# Altium schematic symbol library LTSpiceLibrary.SchLib: 776 symbols (part 3 of 3) (continued)
## LTC6419
designator X?  value LTC6419  InstName: X?
Prefix: X; Value2: LTC6409; Description: Dual 10GHz GBW, 1.1nV/ Hz� Differential Amplifier/ADC Driver; SpiceModel: LTC6.lib
pins: 1 OUT-, 2 IN+, 3 SHDN, 4 V+, 5 VOCM, 6 IN-, 7 OUT+, 8 V-

## LTC6560
designator X?  value LTC6560  InstName: X?
Prefix: X; Description: Single Channel Transimpedance Amplifier with Output Multiplexing; Value2: LTC6560; SpiceModel: LTC3.lib
pins: 1 Vcco, 2 In, 3 Vref, 4 Vcci, 5 O_Mux, 6 OutTerm, 7 Out, 8 Gnd

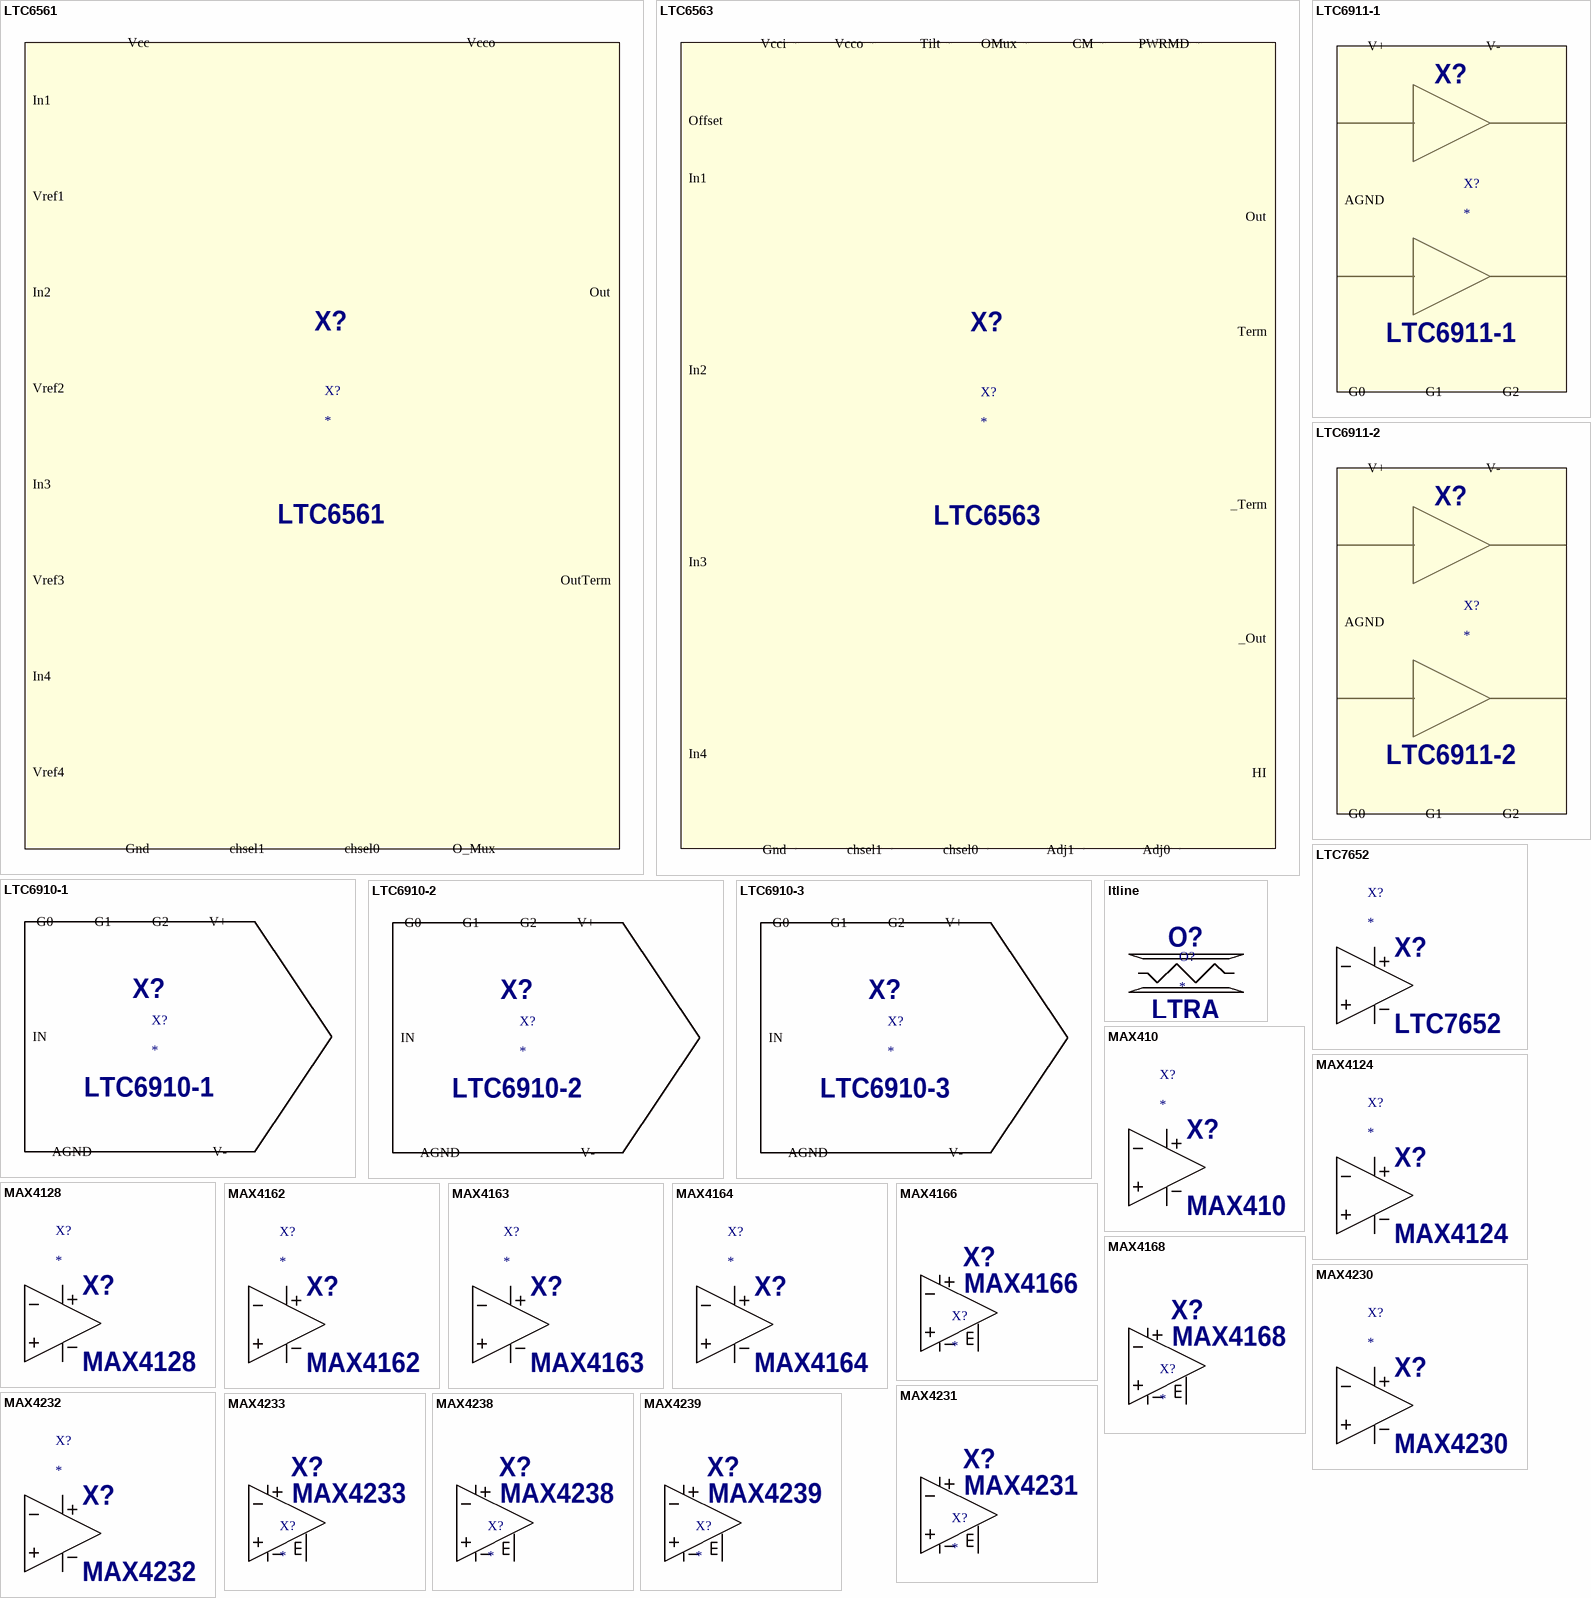
[diagram p24: symbols LTC6561 to MAX4239]

## LTC6561
designator X?  value LTC6561  InstName: X?
Prefix: X; Description: Four-Channel Multiplexed Transimpedance Amplifier with Output Multiplexing; Value2: LTC6561; SpiceModel: LTC7.lib
pins: 1 Vcco, 2 chsel0, 3 Vcc, 4 Vref1, 5 Vref2, 6 Vref3, 7 Vref4, 8 Gnd, 9 In1, 10 In2, 11 In3, 12 In4, 13 O_Mux, 14 chsel1, 15 Out, 16 OutTerm

## LTC6563
designator X?  value LTC6563  InstName: X?
Prefix: X; Description: Four-Channel Multiplexed Transimpedance Amplifier with Output Multiplexing; Value2: LTC6563; SpiceModel: LTC6563.lib
pins: 1 Vcco, 2 Gnd, 3 Vcci, 4 In1, 5 In2, 6 In3, 7 In4, 8 Offset, 9 chsel1, 10 chsel0, 11 Adj1, 12 Adj0, 13 OMux, 14 Tilt, 15 CM, 16 PWRMD, 17 HI, 18 Out, 19 _Out, 20 Term, 21 _Term

## LTC6910-1
designator X?  value LTC6910-1  InstName: X?
Prefix: X; Description: Digitally Controlled Programmable Gain Amplifiers in SOT-23; SpiceModel: LTC1.LIB; Value2: LTC6910-1
pins: 1 OUT, 2 AGND, 3 IN, 4 V-, 5 G0, 6 G1, 7 G2, 8 V+

## LTC6910-2
designator X?  value LTC6910-2  InstName: X?
Prefix: X; Description: Digitally Controlled Programmable Gain Amplifiers in SOT-23; SpiceModel: LTC1.LIB; Value2: LTC6910-2
pins: 1 OUT, 2 AGND, 3 IN, 4 V-, 5 G0, 6 G1, 7 G2, 8 V+

## LTC6910-3
designator X?  value LTC6910-3  InstName: X?
Prefix: X; Description: Digitally Controlled Programmable Gain Amplifiers in SOT-23; SpiceModel: LTC1.LIB; Value2: LTC6910-3
pins: 1 OUT, 2 AGND, 3 IN, 4 V-, 5 G0, 6 G1, 7 G2, 8 V+

## LTC6911-1
designator X?  value LTC6911-1  InstName: X?
Prefix: X; Description: Dual Matched Amplifiers with Digitally Programmable Gain in MSOP; SpiceModel: LTC1.LIB; Value2: LTC6911-1
pins: 1 INA, 2 AGND, 3 INB, 4 G0, 5 G1, 6 G2, 7 V+, 8 OUTB, 9 V-, 10 OUTA

## LTC6911-2
designator X?  value LTC6911-2  InstName: X?
Prefix: X; Description: Dual Matched Amplifiers with Digitally Programmable Gain in MSOP; SpiceModel: LTC1.LIB; Value2: LTC6911-2
pins: 1 INA, 2 AGND, 3 INB, 4 G0, 5 G1, 6 G2, 7 V+, 8 OUTB, 9 V-, 10 OUTA

## LTC7652
designator X?  value LTC7652  InstName: X?
Prefix: X; Value2: LTC1052; Description: Chopper-Stabilized Operational Amplifier; SpiceModel: LTC.lib
pins: 1 In+, 2 In-, 3 V+, 4 V-, 5 OUT

## ltline
designator O?  value LTRA  InstName: O?
Prefix: O; Description: Lossy Transmission Line.  Note: You must supply the .model for this device
pins: 1 I1, 2 R1, 3 I2, 4 R2

## MAX410
designator X?  value MAX410  InstName: X?
Prefix: X; Description: Single/Dual/Quad, 28MHz, Low-Noise, Low-Voltage, Precision Op Amps; SpiceModel: MAX410.lib; Value2: MAX410
pins: 1 In+, 2 In-, 3 V+, 4 V-, 5 OUT

## MAX4124
designator X?  value MAX4124  InstName: X?
Prefix: X; Description: Single/Dual/Quad, Wide-Bandwidth, Low-Power, Single-Supply Rail-to-Rail I/O Op Amps; SpiceModel: MAX4124.lib; Value2: MAX4124
pins: 1 In+, 2 In-, 3 V+, 4 V-, 5 OUT

## MAX4128
designator X?  value MAX4128  InstName: X?
Prefix: X; Description: Single/Dual/Quad, Wide-Bandwidth, Low-Power, Single-Supply Rail-to-Rail I/O Op Amps; SpiceModel: MAX4128.lib; Value2: MAX4128
pins: 1 In+, 2 In-, 3 V+, 4 V-, 5 OUT

## MAX4162
designator X?  value MAX4162  InstName: X?
Prefix: X; Description: UCSP, Micropower, Single-Supply, 10V, Rail-to-Rail I/O Op Amps; SpiceModel: MAX4162.lib; Value2: MAX4162
pins: 1 In+, 2 In-, 3 V+, 4 V-, 5 OUT

## MAX4163
designator X?  value MAX4163  InstName: X?
Prefix: X; Description: UCSP, Micropower, Single-Supply, 10V, Rail-to-Rail I/O Op Amps; SpiceModel: MAX4163.lib; Value2: MAX4163
pins: 1 In+, 2 In-, 3 V+, 4 V-, 5 OUT

## MAX4164
designator X?  value MAX4164  InstName: X?
Prefix: X; Description: UCSP, Micropower, Single-Supply, 10V, Rail-to-Rail I/O Op Amps; SpiceModel: MAX4164.lib; Value2: MAX4164
pins: 1 In+, 2 In-, 3 V+, 4 V-, 5 OUT

## MAX4166
designator X?  value MAX4166  InstName: X?
Prefix: X; Description: High-Output-Drive, Precision, Low-Power, Single-Supply, Rail-to-Rail I/O Op Amps with Shutdown; SpiceModel: MAX4166.lib; Value2: MAX4166
pins: 1 In+, 2 In-, 3 V+, 4 V-, 5 OUT, 6 SHDN

## MAX4168
designator X?  value MAX4168  InstName: X?
Prefix: X; Description: High-Output-Drive, Precision, Low-Power, Single-Supply, Rail-to-Rail I/O Op Amps with Shutdown; SpiceModel: MAX4168.lib; Value2: MAX4168
pins: 1 In+, 2 In-, 3 V+, 4 V-, 5 OUT, 6 SHDN

## MAX4230
designator X?  value MAX4230  InstName: X?
Prefix: X; Description: High-Output-Drive, 10MHz, 10V/us, Rail-to-Rail I/O Op Amps with Shutdown in SC70; SpiceModel: MAX4230.lib; Value2: MAX4230
pins: 1 In+, 2 In-, 3 V+, 4 V-, 5 OUT

## MAX4231
designator X?  value MAX4231  InstName: X?
Prefix: X; Description: High-Output-Drive, 10MHz, 10V/us, Rail-to-Rail I/O Op Amps with Shutdown in SC70; SpiceModel: MAX4231.lib; Value2: MAX4231
pins: 1 In+, 2 In-, 3 V+, 4 V-, 5 OUT, 6 SHDN

## MAX4232
designator X?  value MAX4232  InstName: X?
Prefix: X; Description: High-Output-Drive, 10MHz, 10V/us, Rail-to-Rail I/O Op Amps with Shutdown in SC70; SpiceModel: MAX4232.lib; Value2: MAX4232
pins: 1 In+, 2 In-, 3 V+, 4 V-, 5 OUT

## MAX4233
designator X?  value MAX4233  InstName: X?
Prefix: X; Description: High-Output-Drive, 10MHz, 10V/us, Rail-to-Rail I/O Op Amps with Shutdown in SC70; SpiceModel: MAX4233.lib; Value2: MAX4233
pins: 1 In+, 2 In-, 3 V+, 4 V-, 5 OUT, 6 SHDN

## MAX4238
designator X?  value MAX4238  InstName: X?
Prefix: X; Description: Ultra-Low Offset/Drift, Low-Noise, Precision SOT23 Amplifiers; SpiceModel: MAX4238.lib; Value2: MAX4238
pins: 1 In+, 2 In-, 3 V+, 4 V-, 5 OUT, 6 SHDN

## MAX4239
designator X?  value MAX4239  InstName: X?
Prefix: X; Description: Ultra-Low Offset/Drift, Low-Noise, Precision SOT23 Amplifiers; SpiceModel: MAX4239.lib; Value2: MAX4239
pins: 1 In+, 2 In-, 3 V+, 4 V-, 5 OUT, 6 SHDN

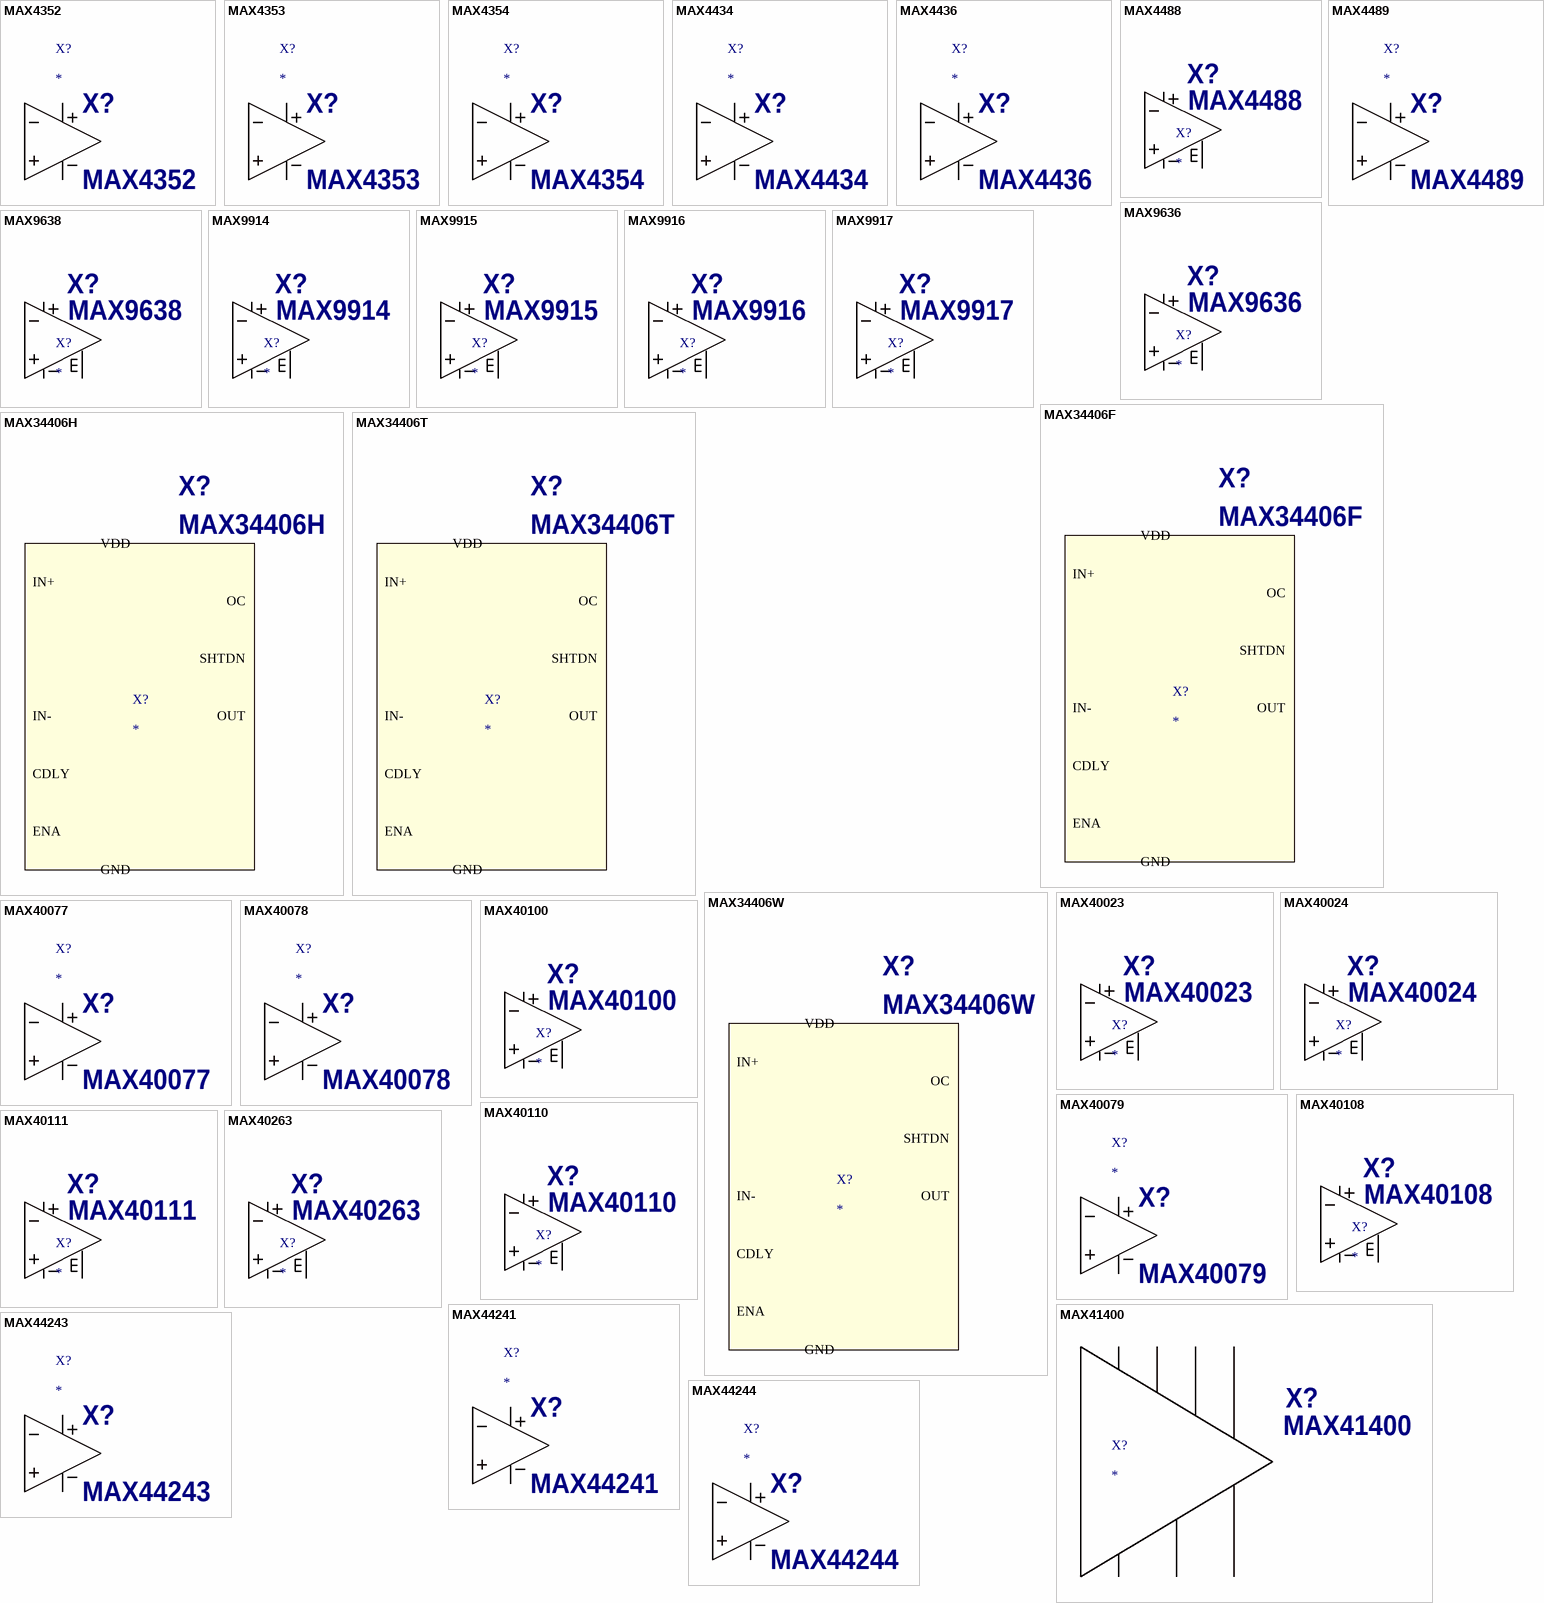
[diagram p25: symbols MAX4352 to MAX44244]

## MAX4352
designator X?  value MAX4352  InstName: X?
Prefix: X; Description: Low-Cost, +3V/+5V, 620uA, 200MHz, Single-Supply Op Amps with Rail-to-Rail Outputs; SpiceModel: MAX4352.lib; Value2: MAX4352
pins: 1 In+, 2 In-, 3 V+, 4 V-, 5 OUT

## MAX4353
designator X?  value MAX4353  InstName: X?
Prefix: X; Description: Low-Cost, +3V/+5V, 620uA, 200MHz, Single-Supply Op Amps with Rail-to-Rail Outputs; SpiceModel: MAX4353.lib; Value2: MAX4353
pins: 1 In+, 2 In-, 3 V+, 4 V-, 5 OUT

## MAX4354
designator X?  value MAX4354  InstName: X?
Prefix: X; Description: Low-Cost, +3V/+5V, 620uA, 200MHz, Single-Supply Op Amps with Rail-to-Rail Outputs; SpiceModel: MAX4354.lib; Value2: MAX4354
pins: 1 In+, 2 In-, 3 V+, 4 V-, 5 OUT

## MAX4434
designator X?  value MAX4434  InstName: X?
Prefix: X; Description: Single-Supply, 150MHz, 16-Bit Accurate, Ultra-Low Distortion Op Amps; SpiceModel: MAX4434.lib; Value2: MAX4434
pins: 1 In+, 2 In-, 3 V+, 4 V-, 5 OUT

## MAX4436
designator X?  value MAX4436  InstName: X?
Prefix: X; Description: Single-Supply, 150MHz, 16-Bit Accurate, Ultra-Low Distortion Op Amps; SpiceModel: MAX4436.lib; Value2: MAX4436
pins: 1 In+, 2 In-, 3 V+, 4 V-, 5 OUT

## MAX4488
designator X?  value MAX4488  InstName: X?
Prefix: X; Description: SOT23, Low-Noise, Low-Distortion, Wide-Band, Rail-to-Rail Op Amps; SpiceModel: MAX4488.lib; Value2: MAX4488
pins: 1 In+, 2 In-, 3 V+, 4 V-, 5 OUT, 6 SHDN

## MAX4489
designator X?  value MAX4489  InstName: X?
Prefix: X; Description: SOT23, Low-Noise, Low-Distortion, Wide-Band, Rail-to-Rail Op Amps; SpiceModel: MAX4489.lib; Value2: MAX4489
pins: 1 In+, 2 In-, 3 V+, 4 V-, 5 OUT

## MAX9636
designator X?  value MAX9636  InstName: X?
Prefix: X; Description: 3V/5V Low-Power, Low-Noise, CMOS, Rail-to-Rail I/O Op Amps; SpiceModel: MAX9636.lib; Value2: MAX9636
pins: 1 In+, 2 In-, 3 V+, 4 V-, 5 OUT, 6 SHDN

## MAX9638
designator X?  value MAX9638  InstName: X?
Prefix: X; Description: 3V/5V Low-Power, Low-Noise, CMOS, Rail-to-Rail I/O Op Amps; SpiceModel: MAX9638.lib; Value2: MAX9638
pins: 1 In+, 2 In-, 3 V+, 4 V-, 5 OUT, 6 SHDN

## MAX9914
designator X?  value MAX9914  InstName: X?
Prefix: X; Description: 1MHz, 20uA, Rail-to-Rail I/O Op Amps with Shutdown; SpiceModel: MAX9914.lib; Value2: MAX9914
pins: 1 In+, 2 In-, 3 V+, 4 V-, 5 OUT, 6 SHDN

## MAX9915
designator X?  value MAX9915  InstName: X?
Prefix: X; Description: 1MHz, 20uA, Rail-to-Rail I/O Op Amps with Shutdown; SpiceModel: MAX9915.lib; Value2: MAX9915
pins: 1 In+, 2 In-, 3 V+, 4 V-, 5 OUT, 6 SHDN

## MAX9916
designator X?  value MAX9916  InstName: X?
Prefix: X; Description: 1MHz, 20uA, Rail-to-Rail I/O Op Amps with Shutdown; SpiceModel: MAX9916.lib; Value2: MAX9916
pins: 1 In+, 2 In-, 3 V+, 4 V-, 5 OUT, 6 SHDN

## MAX9917
designator X?  value MAX9917  InstName: X?
Prefix: X; Description: 1MHz, 20uA, Rail-to-Rail I/O Op Amps with Shutdown; SpiceModel: MAX9917.lib; Value2: MAX9917
pins: 1 In+, 2 In-, 3 V+, 4 V-, 5 OUT, 6 SHDN

## MAX34406F
designator X?  value MAX34406F  InstName: X?
Prefix: X; Description: G=50V/V, Quad Current-Sense Amplifier with Overcurrent Threshold Comparators; SpiceModel: MAX34406F.lib; Value2: MAX34406F
pins: 1 IN+, 2 IN-, 3 VDD, 4 GND, 5 OUT, 6 OC, 7 ENA, 8 SHTDN, 9 CDLY

## MAX34406H
designator X?  value MAX34406H  InstName: X?
Prefix: X; Description: G=100V/V, Quad Current-Sense Amplifier with Overcurrent Threshold Comparators; SpiceModel: MAX34406H.lib; Value2: MAX34406H
pins: 1 IN+, 2 IN-, 3 VDD, 4 GND, 5 OUT, 6 OC, 7 ENA, 8 SHTDN, 9 CDLY

## MAX34406T
designator X?  value MAX34406T  InstName: X?
Prefix: X; Description: G=25V/V, Quad Current-Sense Amplifier with Overcurrent Threshold Comparators; SpiceModel: MAX34406T.lib; Value2: MAX34406T
pins: 1 IN+, 2 IN-, 3 VDD, 4 GND, 5 OUT, 6 OC, 7 ENA, 8 SHTDN, 9 CDLY

## MAX34406W
designator X?  value MAX34406W  InstName: X?
Prefix: X; Description: G=200V/V, Quad Current-Sense Amplifier with Overcurrent Threshold Comparators; SpiceModel: MAX34406W.lib; Value2: MAX34406W
pins: 1 IN+, 2 IN-, 3 VDD, 4 GND, 5 OUT, 6 OC, 7 ENA, 8 SHTDN, 9 CDLY

## MAX40023
designator X?  value MAX40023  InstName: X?
Prefix: X; Description: Low-Noise, Low-Power, Low-Bias-Current Amplifiers; SpiceModel: MAX40023.lib; Value2: MAX40023
pins: 1 In+, 2 In-, 3 V+, 4 V-, 5 OUT, 6 SHDN

## MAX40024
designator X?  value MAX40024  InstName: X?
Prefix: X; Description: Low-Noise, Low-Power, Low-Bias-Current Amplifiers; SpiceModel: MAX40024.lib; Value2: MAX40024
pins: 1 In+, 2 In-, 3 V+, 4 V-, 5 OUT, 6 SHDN

## MAX40077
designator X?  value MAX40077  InstName: X?
Prefix: X; Description: Single/Dual/Quad Ultra-Low Input Bias Current, Low Noise Amplifiers; SpiceModel: MAX40077.lib; Value2: MAX40077
pins: 1 In+, 2 In-, 3 V+, 4 V-, 5 OUT

## MAX40078
designator X?  value MAX40078  InstName: X?
Prefix: X; Description: Single/Dual/Quad Ultra-Low Input Bias Current, Low Noise Amplifiers; SpiceModel: MAX40078.lib; Value2: MAX40078
pins: 1 In+, 2 In-, 3 V+, 4 V-, 5 OUT

## MAX40079
designator X?  value MAX40079  InstName: X?
Prefix: X; Description: Single/Dual/Quad Ultra-Low Input Bias Current, Low Noise Amplifiers; SpiceModel: MAX40079.lib; Value2: MAX40079
pins: 1 In+, 2 In-, 3 V+, 4 V-, 5 OUT

## MAX40100
designator X?  value MAX40100  InstName: X?
Prefix: X; Description: Precision, Low-Power and Low-Noise Op Amp with RRIO; SpiceModel: MAX40100.lib; Value2: MAX40100
pins: 1 In+, 2 In-, 3 V+, 4 V-, 5 OUT, 6 SHDN

## MAX40108
designator X?  value MAX40108  InstName: X?
Prefix: X; Description: 1V, Low-Power, Precision Operational Amplifier; SpiceModel: MAX40108.lib; Value2: MAX40108
pins: 1 In+, 2 In-, 3 V+, 4 V-, 5 OUT, 6 SHDN

## MAX40110
designator X?  value MAX40110  InstName: X?
Prefix: X; Description: 15MHz, Low-Noise, Precision Operational Amplifiers; SpiceModel: MAX40110.lib; Value2: MAX40110
pins: 1 In+, 2 In-, 3 V+, 4 V-, 5 OUT, 6 SHDN

## MAX40111
designator X?  value MAX40111  InstName: X?
Prefix: X; Description: 15MHz, Low-Noise, Precision Operational Amplifiers; SpiceModel: MAX40111.lib; Value2: MAX40111
pins: 1 In+, 2 In-, 3 V+, 4 V-, 5 OUT, 6 SHDN

## MAX40263
designator X?  value MAX40263  InstName: X?
Prefix: X; Description: Voltage 1.8V, 15MHz, Low-Offset, Low-Power, Dual Op Amp in QFN; SpiceModel: MAX40263.lib; Value2: MAX40263
pins: 1 In+, 2 In-, 3 V+, 4 V-, 5 OUT, 6 SHDN

## MAX41400
designator X?  value MAX41400  InstName: X?
Prefix: X; Description: Low-Power, Precision Instrumentation Amplifier with Programmable Gain; SpiceModel: MAX41400.lib; Value2: MAX41400
pins: 1 G0, 2 G1, 3 G2, 4 GND, 5 INM, 6 INP, 7 OUT, 8 REFIN, 9 SHDN_, 10 VDD

## MAX44241
designator X?  value MAX44241  InstName: X?
Prefix: X; Description: 36V, Low-Noise, Precision, Single/Quad/Dual Op Amps; SpiceModel: MAX44241.lib; Value2: MAX44241
pins: 1 In+, 2 In-, 3 V+, 4 V-, 5 OUT

## MAX44243
designator X?  value MAX44243  InstName: X?
Prefix: X; Description: 36V, Low-Noise, Precision, Single/Quad/Dual Op Amps; SpiceModel: MAX44243.lib; Value2: MAX44243
pins: 1 In+, 2 In-, 3 V+, 4 V-, 5 OUT

## MAX44244
designator X?  value MAX44244  InstName: X?
Prefix: X; Description: 36V, Precision, Low-Power, 90uA, Single/Quad/Dual Op Amps; SpiceModel: MAX44244.lib; Value2: MAX44244
pins: 1 In+, 2 In-, 3 V+, 4 V-, 5 OUT

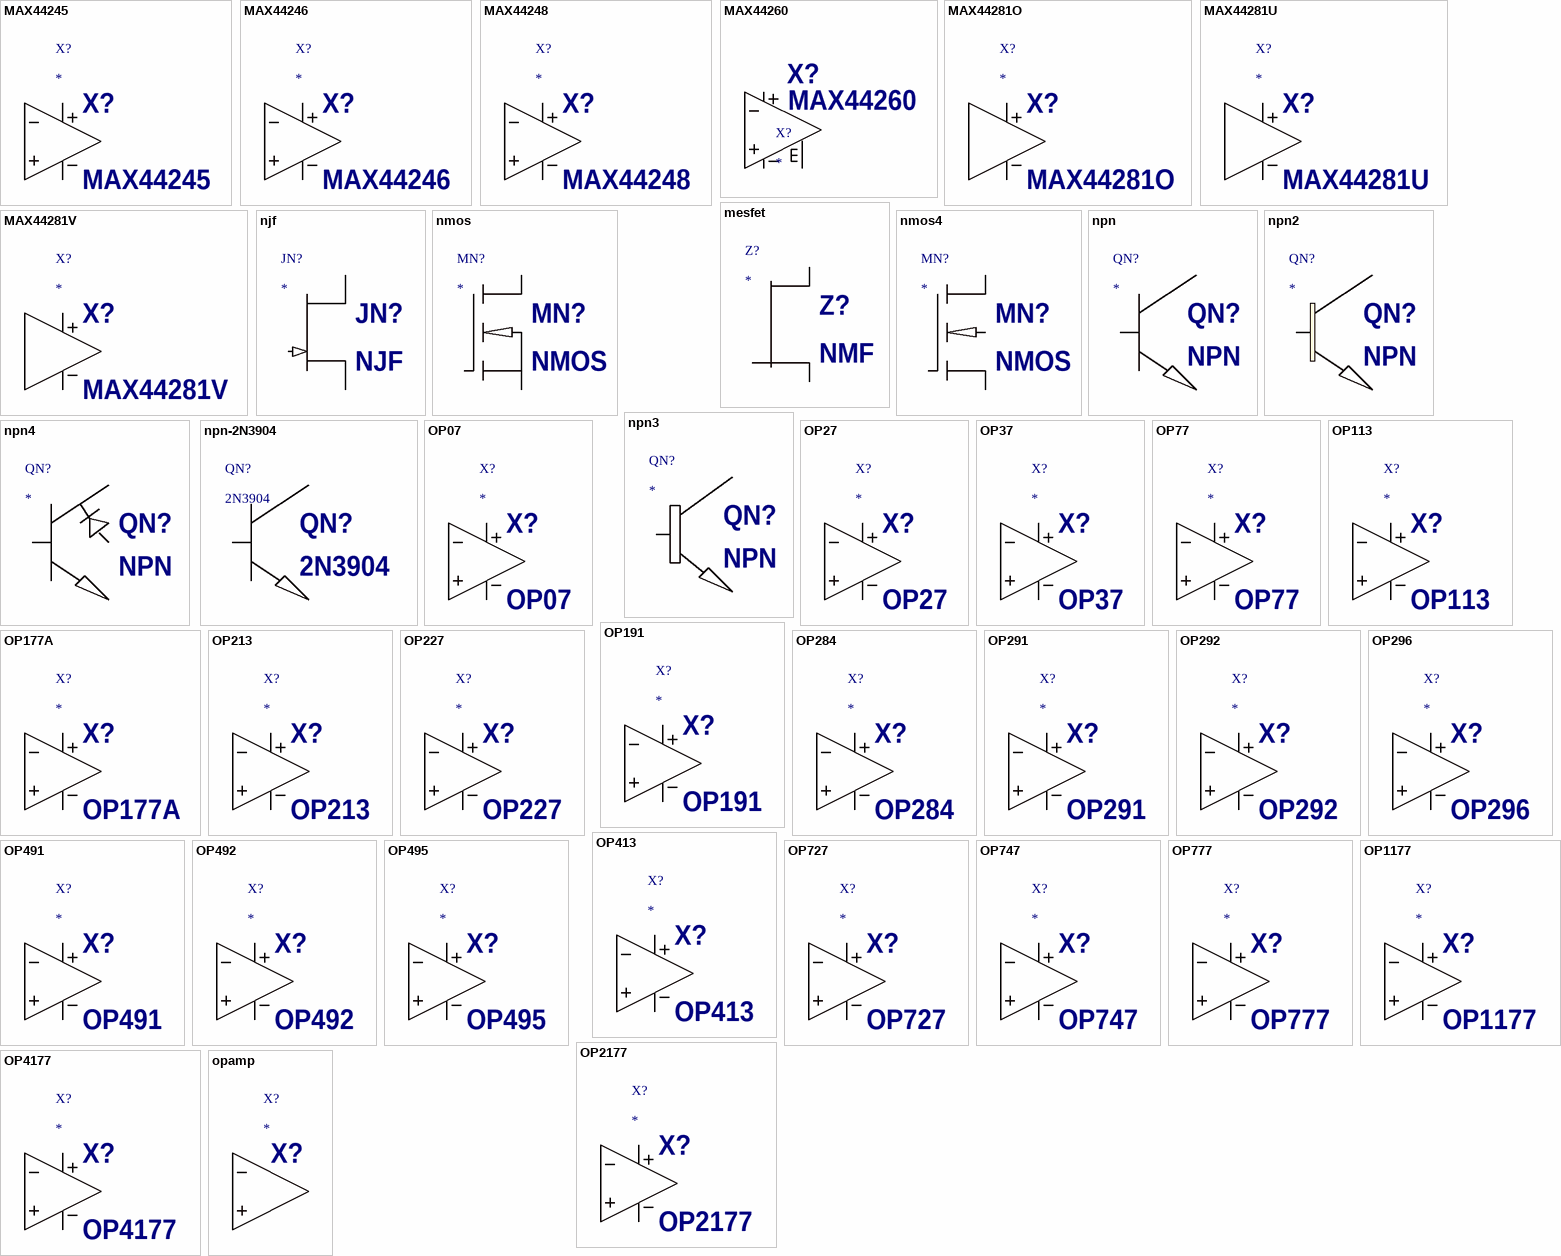
[diagram p26: symbols MAX44245 to opamp]

## MAX44245
designator X?  value MAX44245  InstName: X?
Prefix: X; Description: 36V, Precision, Low-Power, 90uA, Single/Quad/Dual Op Amps; SpiceModel: MAX44245.lib; Value2: MAX44245
pins: 1 In+, 2 In-, 3 V+, 4 V-, 5 OUT

## MAX44246
designator X?  value MAX44246  InstName: X?
Prefix: X; Description: 36V, Low-Noise, Precision, Single/Quad/Dual Op Amps; SpiceModel: MAX44246.lib; Value2: MAX44246
pins: 1 In+, 2 In-, 3 V+, 4 V-, 5 OUT

## MAX44248
designator X?  value MAX44248  InstName: X?
Prefix: X; Description: 36V, Precision, Low-Power, 90uA, Single/Quad/Dual Op Amps; SpiceModel: MAX44248.lib; Value2: MAX44248
pins: 1 In+, 2 In-, 3 V+, 4 V-, 5 OUT

## MAX44260
designator X?  value MAX44260  InstName: X?
Prefix: X; Description: 1.8V, 15MHz Low-Offset, Low-Power, Rail-to-Rail I/O Op Amps; SpiceModel: MAX44260.lib; Value2: MAX44260
pins: 1 In+, 2 In-, 3 V+, 4 V-, 5 OUT, 6 SHDN

## MAX44281O
designator X?  value MAX44281O  InstName: X?
Prefix: X; Description: Ultra-Small, Ultra-Thin, 4-Bump Op Amp; SpiceModel: MAX44281O.lib; Value2: MAX44281O
pins: 1 IN, 2 VDD, 3 GND, 4 OUT

## MAX44281U
designator X?  value MAX44281U  InstName: X?
Prefix: X; Description: Ultra-Small, Ultra-Thin, 4-Bump Op Amp; SpiceModel: MAX44281U.lib; Value2: MAX44281U
pins: 1 IN, 2 VDD, 3 GND, 4 OUT

## MAX44281V
designator X?  value MAX44281V  InstName: X?
Prefix: X; Description: Ultra-Small, Ultra-Thin, 4-Bump Op Amp; SpiceModel: MAX44281V.lib; Value2: MAX44281V
pins: 1 IN, 2 VDD, 3 GND, 4 OUT

## mesfet
designator Z?  value NMF  InstName: Z?
Prefix: Z; Description: GaAs MESFET transistor  Note: You must supply the .model for this device
pins: 1 D, 2 G, 3 S

## njf
designator JN?  value NJF  InstName: JN?
Prefix: JN; Description: N-Channel JFET
pins: 1 D, 2 G, 3 S

## nmos
designator MN?  value NMOS  InstName: MN?
Prefix: MN; Description: N-Channel MOSFET transistor
pins: 1 D, 2 G, 3 S

## nmos4
designator MN?  value NMOS  InstName: MN?
Prefix: MN; Description: N-Channel MOSFET transistor with explicit substrate connection(used for monolithic MOSFETS)
pins: 1 D, 2 G, 3 S, 4 B

## npn
designator QN?  value NPN  InstName: QN?
Prefix: QN; Description: Bipolar NPN transistor
pins: 1 C, 2 B, 3 E

## npn2
designator QN?  value NPN  InstName: QN?
Prefix: QN; Description: Bipolar NPN transistor
pins: 1 C, 2 B, 3 E

## npn3
designator QN?  value NPN  InstName: QN?
Prefix: QN; Description: Bipolar NPN transistor
pins: 1 C, 2 B, 3 E

## npn4
designator QN?  value NPN  InstName: QN?
Prefix: QN; Description: Bipolar NPN transistor with substrate node.  You would normally use this with your own .model statement.
pins: 1 C, 2 B, 3 E, 4 S

## npn-2N3904
designator QN?, comment 2N3904  InstName: QN?
Prefix: QN; Description: Bipolar NPN transistor; Value: 2N3904
simulation model npn-2N3904
pins: 1 C, 2 B, 3 E

## OP07
designator X?  value OP07  InstName: X?
Prefix: X; Value2: LT1001; Description: Precision Operational Amplifier; SpiceModel: LTC.lib
pins: 1 In+, 2 In-, 3 V+, 4 V-, 5 OUT

## OP27
designator X?  value OP27  InstName: X?
Prefix: X; Description: Low Noise, Precision, High Speed Operational Amplifier; SpiceModel: ADI.lib; Value2: OP27
pins: 1 In+, 2 In-, 3 V+, 4 V-, 5 OUT

## OP37
designator X?  value OP37  InstName: X?
Prefix: X; Description: Low Noise, Precision, High Speed Operational Amplifier(Avcl > -5); SpiceModel: ADI.lib; Value2: OP37
pins: 1 In+, 2 In-, 3 V+, 4 V-, 5 OUT

## OP77
designator X?  value OP77  InstName: X?
Prefix: X; Description: Precision Operational Amplifier; SpiceModel: ADI.lib; Value2: OP77
pins: 1 In+, 2 In-, 3 V+, 4 V-, 5 OUT

## OP113
designator X?  value OP113  InstName: X?
Prefix: X; Description: 4/30V BIP OP Low Noise Low Drift; SpiceModel: ADI.lib; Value2: OP113
pins: 1 In+, 2 In-, 3 V+, 4 V-, 5 OUT

## OP177A
designator X?  value OP177A  InstName: X?
Prefix: X; Description: Precision Operational Amplifier; SpiceModel: ADI.lib; Value2: OP177A
pins: 1 In+, 2 In-, 3 V+, 4 V-, 5 OUT

## OP191
designator X?  value OP191  InstName: X?
Prefix: X; Description: 2.7/12V BIP OP RRIO OVP; SpiceModel: ADI.lib; Value2: OP191
pins: 1 In+, 2 In-, 3 V+, 4 V-, 5 OUT

## OP213
designator X?  value OP213  InstName: X?
Prefix: X; Description: 4/30V BIP OP Low Noise Low Drift; SpiceModel: ADI.lib; Value2: OP213
pins: 1 In+, 2 In-, 3 V+, 4 V-, 5 OUT

## OP227
designator X?  value OP227  InstName: X?
Prefix: X; Value2: OP27; Description: Dual Low Noise, Precision, High Speed Operational Amplifier; SpiceModel: ADI.lib
pins: 1 In+, 2 In-, 3 V+, 4 V-, 5 OUT

## OP284
designator X?  value OP284  InstName: X?
Prefix: X; Description: Precision Rail to Rail I/O Op Amp; SpiceModel: ADI1.lib; Value2: OP284
pins: 1 In+, 2 In-, 3 V+, 4 V-, 5 OUT

## OP291
designator X?  value OP291  InstName: X?
Prefix: X; Description: 2.7/12V BIP OP RRIO OVP; SpiceModel: ADI.lib; Value2: OP291
pins: 1 In+, 2 In-, 3 V+, 4 V-, 5 OUT

## OP292
designator X?  value OP292  InstName: X?
Prefix: X; Description: Dual Single-Supply Op Amp; SpiceModel: ADI1.lib; Value2: OP292
pins: 1 In+, 2 In-, 3 V+, 4 V-, 5 OUT

## OP296
designator X?  value OP296  InstName: X?
Prefix: X; Description: 3/15V BIP OP Low Pwr RRIO; SpiceModel: ADI.lib; Value2: OP296
pins: 1 In+, 2 In-, 3 V+, 4 V-, 5 OUT

## OP413
designator X?  value OP413  InstName: X?
Prefix: X; Description: 4/30V BIP OP Low Noise Low Drift; SpiceModel: ADI.lib; Value2: OP413
pins: 1 In+, 2 In-, 3 V+, 4 V-, 5 OUT

## OP491
designator X?  value OP491  InstName: X?
Prefix: X; Description: 2.7/12V BIP OP RRIO OVP; SpiceModel: ADI.lib; Value2: OP491
pins: 1 In+, 2 In-, 3 V+, 4 V-, 5 OUT

## OP492
designator X?  value OP492  InstName: X?
Prefix: X; Description: 4.5/33V BIP OP Low Cost Single Supply; SpiceModel: ADI.lib; Value2: OP492
pins: 1 In+, 2 In-, 3 V+, 4 V-, 5 OUT

## OP495
designator X?  value OP495  InstName: X?
Prefix: X; Description: 3/30V BIP OP RRO Single Supply; SpiceModel: ADI.lib; Value2: OP495
pins: 1 In+, 2 In-, 3 V+, 4 V-, 5 OUT

## OP727
designator X?  value OP727  InstName: X?
Prefix: X; Description: 2.7/30V BIP OP Single Supply RRO; SpiceModel: ADI.lib; Value2: OP727
pins: 1 In+, 2 In-, 3 V+, 4 V-, 5 OUT

## OP747
designator X?  value OP747  InstName: X?
Prefix: X; Description: 2.7/30V BIP OP Single Supply RRO; SpiceModel: ADI.lib; Value2: OP747
pins: 1 In+, 2 In-, 3 V+, 4 V-, 5 OUT

## OP777
designator X?  value OP777  InstName: X?
Prefix: X; Description: 2.7/30V BIP OP Single Supply RRO; SpiceModel: ADI.lib; Value2: OP777
pins: 1 In+, 2 In-, 3 V+, 4 V-, 5 OUT

## OP1177
designator X?  value OP1177  InstName: X?
Prefix: X; Description: Precision, Low Noise, Low Input Bias Current Operational Amplifier; SpiceModel: ADI1.lib; Value2: OP1177
pins: 1 In+, 2 In-, 3 V+, 4 V-, 5 OUT

## OP2177
designator X?  value OP2177  InstName: X?
Prefix: X; Description: Dual Precision Low Noise Low Input Bias Current Op Amp; SpiceModel: ADI1.lib; Value2: OP2177
pins: 1 In+, 2 In-, 3 V+, 4 V-, 5 OUT

## OP4177
designator X?  value OP4177  InstName: X?
Prefix: X; Description: Quad Precision Low Noise Low Input Bias Current Op Amp; SpiceModel: ADI1.lib; Value2: OP4177
pins: 1 In+, 2 In-, 3 V+, 4 V-, 5 OUT

## opamp
designator X?  InstName: X?
Value: opamp; Prefix: X; Description: Ideal single-pole operational amplifier. You must .lib opamp.sub; SpiceLine: Aol=100K; SpiceLine2: GBW=10Meg
pins: 1 invin, 2 noninvin, 3 out

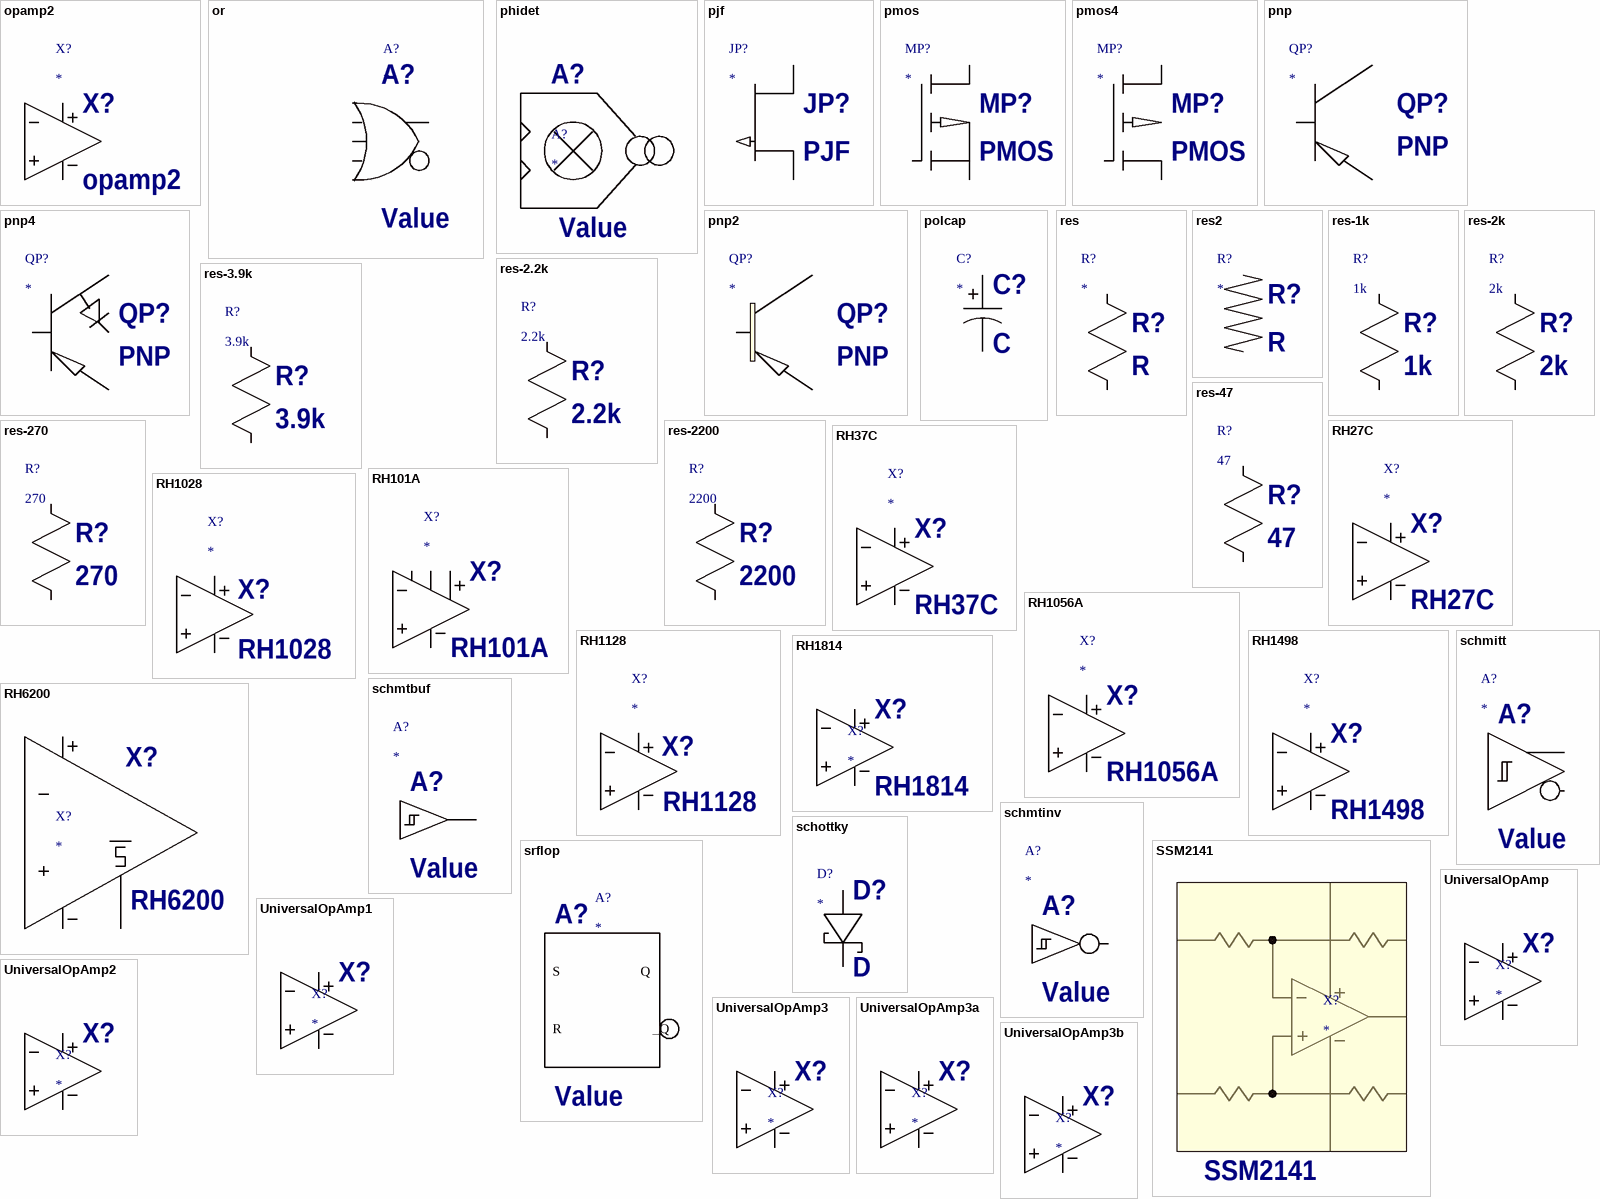
[diagram p27: symbols opamp2 to UniversalOpAmp3b]

## opamp2
designator X?  value opamp2  InstName: X?
Prefix: X; Description: Basic Operational Amplifier symbol for use with subcircuits in the file ./lib/sub/LTC.lib.  You must give the value a name and include this file.
pins: 1 In+, 2 In-, 3 V+, 4 V-, 5 OUT

## or
designator A?  InstName: A?
Prefix: A; Description: Behavioral OR gate with complementary outputs; Value: Value; SpiceModel: OR
pins: 1 a, 2 b, 3 c, 4 d, 5 e, 6 _Q, 7 Q, 8 com

## phidet
designator A?  InstName: A?
Prefix: A; Description: Behavioral Type 3/4 Phase Detector (phase/frequency detector).  NOTE: Limit input rise times; Value: Value; SpiceModel: PHASEDET
pins: 1 a, 2 b, 3 Q, 4 com

## pjf
designator JP?  value PJF  InstName: JP?
Prefix: JP; Description: P-Channel JFET transistor
pins: 1 D, 2 G, 3 S

## pmos
designator MP?  value PMOS  InstName: MP?
Prefix: MP; Description: P-Channel MOSFET transistor
pins: 1 D, 2 G, 3 S

## pmos4
designator MP?  value PMOS  InstName: MP?
Prefix: MP; Description: P-Channel MOSFET transistor with explicit substrate connection(used for monolithic MOSFETS)
pins: 1 D, 2 G, 3 S, 4 B

## pnp
designator QP?  value PNP  InstName: QP?
Prefix: QP; Description: Bipolar PNP transistor
pins: 1 C, 2 B, 3 E

## pnp2
designator QP?  value PNP  InstName: QP?
Prefix: QP; Description: Bipolar PNP transistor
pins: 1 C, 2 B, 3 E

## pnp4
designator QP?  value PNP  InstName: QP?
Prefix: QP; Description: Bipolar PNP transistor with substrate node.  You would normally use this with your own .model statement.
pins: 1 C, 2 B, 3 E, 4 S

## polcap
designator C?  value C  InstName: C?
Description: Polarized Capacitor; Prefix: C
pins: 1 A, 2 B

## res
designator R?  value R  InstName: R?
Description: A resistor; Prefix: R
pins: 1 A, 2 B

## res2
designator R?  value R  InstName: R?
Description: A resistor; Prefix: R
pins: 1 A, 2 B

## res-1k
designator R?, comment 1k  InstName: R?
Prefix: R; Description: A resistor; Value: 1k
simulation model res-1k
pins: 1 A, 2 B

## res-2.2k
designator R?, comment 2.2k  InstName: R?
Prefix: R; Description: A resistor; Value: 2.2k
simulation model res-2.2k
pins: 1 A, 2 B

## res-2k
designator R?, comment 2k  InstName: R?
Prefix: R; Description: A resistor; Value: 2k
simulation model res-2k
pins: 1 A, 2 B

## res-3.9k
designator R?, comment 3.9k  InstName: R?
Prefix: R; Description: A resistor; Value: 3.9k
simulation model res-3.9k
pins: 1 A, 2 B

## res-47
designator R?, comment 47  InstName: R?
Prefix: R; Description: A resistor; Value: 47
simulation model res-47
pins: 1 A, 2 B

## res-270
designator R?, comment 270  InstName: R?
Prefix: R; Description: A resistor; Value: 270
simulation model res-270
pins: 1 A, 2 B

## res-2200
designator R?, comment 2200  InstName: R?
Prefix: R; Description: A resistor; Value: 2200
simulation model res-2200
pins: 1 A, 2 B

## RH27C
designator X?  value RH27C  InstName: X?
Prefix: X; Description: Low noise High Speed Precision Operational Amplifier; SpiceModel: LTC.lib; Value2: RH27C
pins: 1 In+, 2 In-, 3 V+, 4 V-, 5 OUT

## RH37C
designator X?  value RH37C  InstName: X?
Prefix: X; Description: Low noise High Speed Precision Operational Amplifier; SpiceModel: LTC.lib; Value2: RH37C
pins: 1 In+, 2 In-, 3 V+, 4 V-, 5 OUT

## RH101A
designator X?  value RH101A  InstName: X?
Prefix: X; Description: Operational Amplifier\n\nNOTE:  Model is best effort of typical performance at room temperature.; SpiceModel: LTC.lib; Value2: RH101A
pins: 1 COMP1, 2 In-, 3 In+, 4 V-, 5 OUT, 6 V+, 7 COMP2

## RH1028
designator X?  value RH1028  InstName: X?
Prefix: X; Value2: LT1028; Description: Ultra-Low Noise Precision High Speed Operational Amplifier; SpiceModel: LTC.lib
pins: 1 In+, 2 In-, 3 V+, 4 V-, 5 OUT

## RH1056A
designator X?  value RH1056A  InstName: X?
Prefix: X; Value2: LT1056; Description: Precision, High Speed, JFET Input Operational Amplifier; SpiceModel: LTC.lib
pins: 1 In+, 2 In-, 3 V+, 4 V-, 5 OUT

## RH1128
designator X?  value RH1128  InstName: X?
Prefix: X; Value2: LT1128; Description: Ultra-Low Noise Precision High Speed Operational Amplifier; SpiceModel: LTC.lib
pins: 1 In+, 2 In-, 3 V+, 4 V-, 5 OUT

## RH1498
designator X?  value RH1498  InstName: X?
Prefix: X; Value2: LT1498; Description: Dual 10MHz, 6V/�s, Rail-to-Rail Input and Output Precision C-Load Operational Amplifier; SpiceModel: LTC.lib
pins: 1 In+, 2 In-, 3 V+, 4 V-, 5 OUT

## RH1814
designator X?  value RH1814  InstName: X?
Prefix: X; Value2: LT1813; Description: Quad 3mA, 100MHz, 750V/�s Operational Amplifier(1 of 4); SpiceModel: LTC.lib
pins: 1 In+, 2 In-, 3 V+, 4 V-, 5 OUT

## RH6200
designator X?  value RH6200  InstName: X?
Prefix: X; Value2: LT6200; Description: 165 MHz, Rail-to-Rail Input and Output, 0.95nV/rtHz Low Noise Op Amp; SpiceModel: LTC2.LIB
pins: 1 IN+, 2 IN-, 3 OUT, 4 VCC, 5 VEE, 6 SHDN_L

## schmitt
designator A?  InstName: A?
Prefix: A; Description: Behavioral Schmitt-Triggered buffer with complementary outs; Value: Value; SpiceModel: SCHMITT
pins: 1 in, 2 _Q, 3 Q, 4 com

## schmtbuf
designator A?  InstName: A?
Prefix: A; Description: Behavioral Schmitt-Triggered buffer; Value: Value; SpiceModel: SCHMITT
pins: 1 in, 2 Q, 3 com

## schmtinv
designator A?  InstName: A?
Prefix: A; Description: Behavioral Schmitt-Triggered inverter; Value: Value; SpiceModel: SCHMITT
pins: 1 in, 2 _Q, 3 com

## schottky
designator D?  value D  InstName: D?
Description: Schottky diode; Prefix: D
pins: 1 +, 2 -

## srflop
designator A?  InstName: A?
Prefix: A; Description: Behavioral Set-Reset Flipflop; Value: Value; SpiceModel: SRFLOP
pins: 1 S, 2 R, 3 _Q, 4 Q, 5 com

## SSM2141
designator X?  value SSM2141
InstName: X?; Prefix: X; Description: High Common-Mode Rejection Differential Line Receiver; SpiceModel: ADI.lib; Value2: SSM2141
pins: 1 Ref, 2 -IN, 3 +IN, 4 Vee, 5 SENSE, 6 OUT, 7 Vcc

## UniversalOpAmp
designator X?  InstName: X?
Prefix: X; Description: A linear, single pole op amp with no internal nodes or output voltage range limit. See Educational/UniversalOpAmp.asc for more details.; Value2: Avol=1Meg GBW=10Meg Vos=0; ModelFile: UniversalOpAmp1.lib; Value: Value; SpiceModel: level1; SpiceLine: En=0 Enk=0 In=0 Ink=0 Rin=500Meg
simulation model UniversalOpAmp
pins: 1 In+, 2 In-, 3 V+, 4 V-, 5 OUT

## UniversalOpAmp1
designator X?  InstName: X?
Prefix: X; Description: A linear, single pole op amp with no internal nodes or output voltage range limit. See Educational/UniversalOpAmp.asc for more details.; Value2: Avol=1Meg GBW=10Meg Vos=0; ModelFile: UniversalOpAmp1.lib; Value: Value; SpiceModel: level1; SpiceLine: En=0 Enk=0 In=0 Ink=0 Rin=500Meg
pins: 1 In+, 2 In-, 3 V+, 4 V-, 5 OUT

## UniversalOpAmp2
designator X?  InstName: X?
Prefix: X; Description: A single pole op amp with one internal node, slew rate limit, and output voltage and current limit. See Educational/UniversalOpAmp.asc for more details.; Value2: Avol=1Meg GBW=10Meg Slew=10Meg; ModelFile: UniversalOpAmp2.lib; Value: Value; SpiceModel: level2; SpiceLine: Ilimit=25m Rail=0 Vos=0; SpiceLine2: En=0 Enk=0 In=0 Ink=0 Rin=500Meg
pins: 1 In+, 2 In-, 3 V+, 4 V-, 5 OUT

## UniversalOpAmp3
designator X?  InstName: X?
Prefix: X; Description: A two pole op amp with programmable phase margin, slew rate limit, and output voltage and current limit. See Educational/UniversalOpAmp.asc for more details.; Value2: Avol=1Meg GBW=10Meg Slew=10Meg; ModelFile: UniversalOpAmp3a.lib; Value: Value; SpiceModel: level3a; SpiceLine: Ilimit=25m Rail=0 Vos=0 Phimargin=45; SpiceLine2: En=0 Enk=0 In=0 Ink=0 Rin=500Meg
pins: 1 In+, 2 In-, 3 V+, 4 V-, 5 OUT

## UniversalOpAmp3a
designator X?  InstName: X?
Prefix: X; Description: A two pole op amp with programmable phase margin, slew rate limit, and output voltage and current limit. See Educational/UniversalOpAmp.asc for more details.; Value2: Avol=1Meg GBW=10Meg Slew=10Meg; ModelFile: UniversalOpAmp3a.lib; Value: Value; SpiceModel: level3a; SpiceLine: Ilimit=25m Rail=0 Vos=0 Phimargin=45; SpiceLine2: En=0 Enk=0 In=0 Ink=0 Rin=500Meg
pins: 1 In+, 2 In-, 3 V+, 4 V-, 5 OUT

## UniversalOpAmp3b
designator X?  InstName: X?
Prefix: X; Description: A two pole op amp with delay, programmable phase margin, slew rate limit, and output voltage and current limit. See Educational/UniversalOpAmp.asc for more details.; Value2: Avol=1Meg GBW=10Meg Slew=10Meg; ModelFile: UniversalOpAmp3b.lib; Value: Value; SpiceModel: level3b; SpiceLine: Ilimit=25m Rail=0 Vos=0 Phimargin=45; SpiceLine2: En=0 Enk=0 In=0 Ink=0 Rin=500Meg
pins: 1 In+, 2 In-, 3 V+, 4 V-, 5 OUT

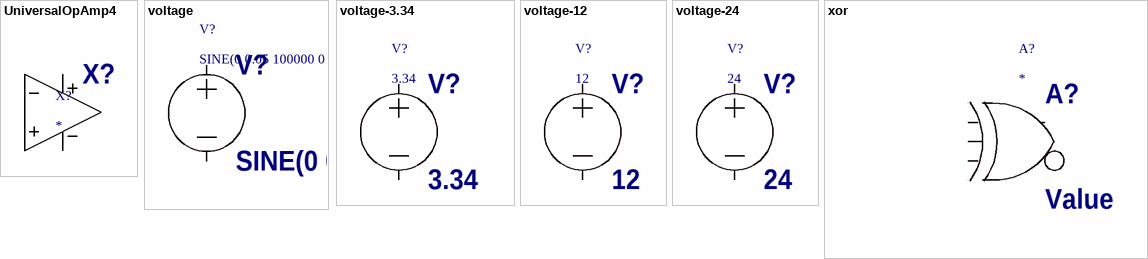
[diagram p28: symbols UniversalOpAmp4 to xor]

## UniversalOpAmp4
designator X?  InstName: X?
Prefix: X; Description: A two pole op amp with virtual ground, input and output impedance, programmable phase margin, slew rate limit, and output voltage and current limit. See Educational/UniversalOpAmp.asc for more details.; Value2: Avol=1Meg GBW=10Meg Slew=10Meg; ModelFile: UniversalOpAmp4.lib; Value: Value; SpiceModel: level4; SpiceLine: Ilimit=25m Rail=0 Vos=0 Phimargin=45; SpiceLine2: En=0 Enk=0 In=0 Ink=0 Rin=500Meg Ro=1k Ccm=1p Cdiff=2p
pins: 1 In+, 2 In-, 3 V+, 4 V-, 5 OUT

## voltage
designator V?, comment SINE(0 0.05 100000 0 0 0 5000)  InstName: V?
SINE voltage source; Prefix: V; Description: Voltage Source, either DC, AC, PULSE, SINE, PWL, EXP, or SFFM; Value: SINE(0 0.05 100000 0 0 0 5000)
simulation model voltage
pins: 1 +, 2 -

## voltage-3.34
designator V?, comment 3.34  InstName: V?
voltage source; Prefix: V; Description: Voltage Source, either DC, AC, PULSE, SINE, PWL, EXP, or SFFM; Value: 3.34
simulation model voltage-3.34
pins: 1 +, 2 -

## voltage-12
designator V?, comment 12  InstName: V?
voltage source; Prefix: V; Description: Voltage Source, either DC, AC, PULSE, SINE, PWL, EXP, or SFFM; Value: 12
simulation model voltage-12
pins: 1 +, 2 -

## voltage-24
designator V?, comment 24  InstName: V?
voltage source; Prefix: V; Description: Voltage Source, either DC, AC, PULSE, SINE, PWL, EXP, or SFFM; Value: 24
simulation model voltage-24
pins: 1 +, 2 -

## xor
designator A?  InstName: A?
Prefix: A; Description: Behavioral XOR gate; Value: Value; SpiceModel: XOR
pins: 1 a, 2 b, 3 c, 4 d, 5 e, 6 _Q, 7 Q, 8 com